# Altium footprint library LegacyRez-Axial Pot.PcbLib: 113 footprints (part 5 of 8)
Each footprint in its own frame and in the unit in brackets; x right, y up, seen from the top. Pads: shape width x height; smd on the part's side, far side on the other; paste and mask are expansions set on the pad; w line width, h text height; cw(c..) or ccw(c..) is an arc to the next point about the centre after c.
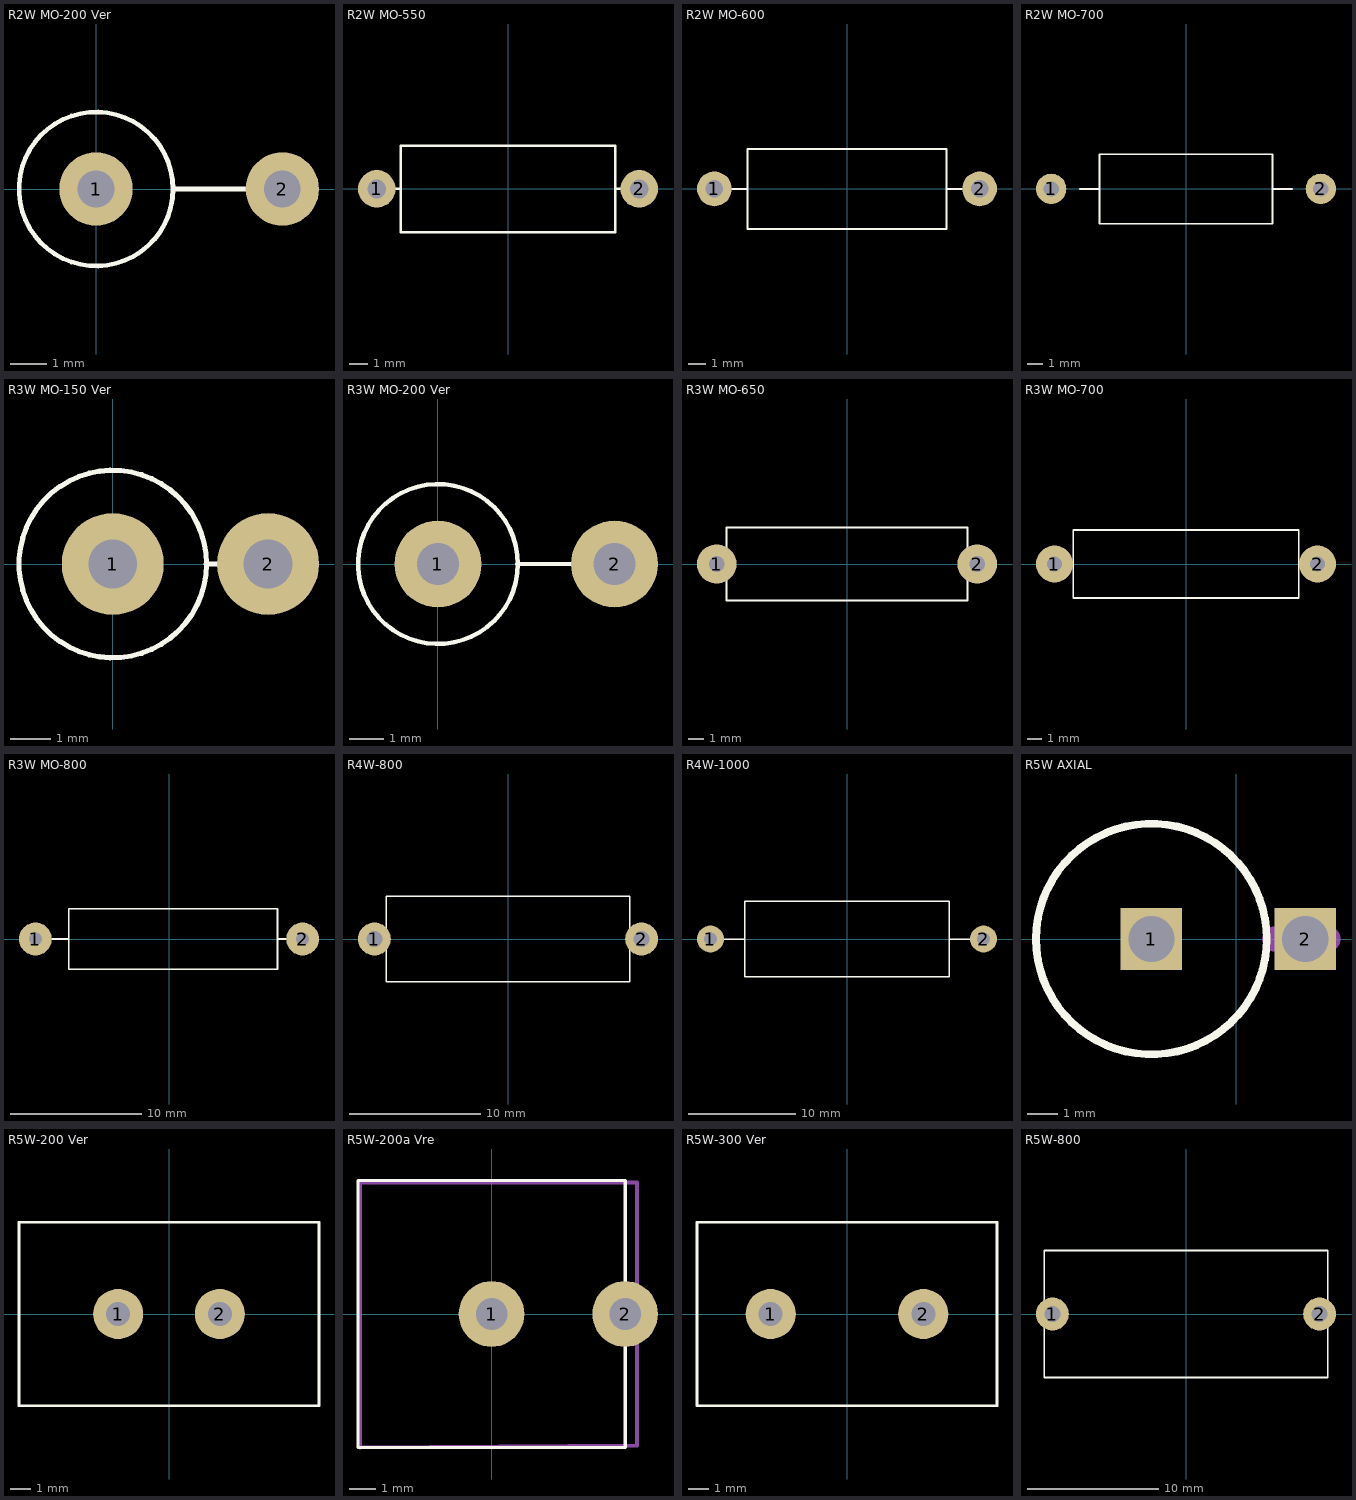
[diagram p4: the footprints below, top view; thin cyan lines are the x and y axes]

## R2W MO-200 Ver [mm]
pads (2):
  round 2 hole 1: 1(0,0) 2(5.08,0)
TopOverlay:
  circle w0.127: c0,0 r2.1
  lines w0.127: 2.1,0 4.572,0
3D body "Res-(2W)MO-200 Ver.STEP": height 15.95, standoff -2.03, extent -2.302,-2.302 5.48,2.302

## R2W MO-550 [mm]
pads (2):
  round 2 hole 1: 1(-6.985,0) 2(6.985,0)
TopOverlay:
  lines w0.127: -6.35,0 -5.715,0 ; 5.715,0 6.35,0 ; -5.715,-2.3 5.715,-2.3 5.715,2.286 -5.715,2.286 -5.715,-2.3
3D body "Res-(2W)MO-550.STEP": height 4.6, standoff -2.54, extent -7.285,-2.3 7.285,2.3

## R2W MO-600 [mm]
pads (2):
  round 2 hole 1: 1(-7.62,0) 2(7.62,0)
TopOverlay:
  lines w0.127: -6.985,0 -5.715,0 ; 5.715,0 6.985,0 ; -5.715,-2.3 5.715,-2.3 5.715,2.286 -5.715,2.286 -5.715,-2.3
3D body "Res-(2W)MO-600.STEP": height 4.6, standoff -2.54, extent -7.92,-2.3 7.92,2.3

## R2W MO-700 [mm]
pads (2):
  round 2 hole 1: 1(-8.89,0) 2(8.89,0)
TopOverlay:
  lines w0.127: -6.985,0 -5.715,0 ; 5.715,0 6.985,0 ; -5.715,-2.3 5.715,-2.3 5.715,2.286 -5.715,2.286 -5.715,-2.3
3D body "Res-(2W)MO-700.STEP": height 4.6, standoff -2.54, extent -9.19,-2.3 9.19,2.3

## R3W MO-150 Ver [mm]
pads (2):
  round 2.5 hole 1.2: 1(0,0) 2(3.81,0)
TopOverlay:
  circle w0.127: c0,0 r2.3
  lines w0.127: 2.286,0 3.175,0
3D body "Res-(3W)MO-150 Ver.STEP": height 18.31, standoff -2.03, extent -2.302,-2.302 4.21,2.302

## R3W MO-200 Ver [mm]
pads (2):
  round 2.5 hole 1.2: 1(0,0) 2(5.08,0)
TopOverlay:
  circle w0.127: c0,0 r2.3
  lines w0.127: 2.286,0 4.445,0
3D body "Res-(3W)MO-200 Ver.STEP": height 18.95, standoff -2.03, extent -2.302,-2.302 5.48,2.302

## R3W MO-650 [mm]
pads (2):
  round 2.5 hole 1: 1(-8.255,0) 2(8.255,0)
TopOverlay:
  lines w0.127: -8.255,0 -7.62,0 ; 7.62,0 8.255,0 ; -7.62,-2.302 -7.62,2.302 7.62,2.302 7.62,-2.302 -7.62,-2.302
3D body "Res-(3W)MO-650.STEP": height 4.6, standoff -2.54, extent -8.605,-2.302 8.605,2.302

## R3W MO-700 [mm]
pads (2):
  round 2.5 hole 1: 1(-8.89,0) 2(8.89,0)
TopOverlay:
  lines w0.127: -8.89,0 -7.62,0 ; 7.62,0 8.89,0 ; -7.62,-2.302 7.62,-2.302 7.62,2.302 -7.62,2.302 -7.62,-2.302
3D body "Res-(3W)MO-700.STEP": height 4.6, standoff -2.54, extent -9.24,-2.302 9.24,2.302

## R3W MO-800 [mm]
pads (2):
  round 2.5 hole 1: 1(-10.16,0) 2(10.16,0)
TopOverlay:
  lines w0.127: -10.16,0 -7.62,0 ; 8.255,0 10.16,0 ; -7.62,-2.302 8.255,-2.302 8.255,2.302 -7.62,2.302 -7.62,-2.302
3D body "Res-(3W)MO-800.STEP": height 4.6, standoff -2.54, extent -10.51,-2.302 10.51,2.302

## R4W-800 [mm]
pads (2):
  round 2.5 hole 1.2: 1(-10.16,0) 2(10.16,0)
TopOverlay:
  lines w0.127: -9.5,0 -9.25,0 ; 9.25,0 9.5,0 ; -9.25,-3.25 -9.25,3.25 9.25,3.25 9.25,-3.25 -9.25,-3.25
3D body "Res 350-8 0.01om.STEP": height 6.5, standoff -2.5, extent -10.56,-3.25 10.56,3.25

## R4W-1000 [mm]
pads (2):
  round 2.5 hole 1.2: 1(-12.7,0) 2(12.7,0)
TopOverlay:
  lines w0.127: -12.7,0 -9.525,0 ; 9.525,0 12.7,0 ; -9.525,-3.5 9.525,-3.5 9.525,3.5 -9.525,3.5 -9.525,-3.5
3D body "Res-(4W)-1000.STEP": height 7.51, standoff -2.94, extent -12.7,-3.5 13.58,3.5

## R5W AXIAL [mm]
pads (2):
  rect 2x2 hole 1.5: 1(-2.75,0) 2(2.25,0)
TopOverlay:
  circle w0.254: c-2.75,0 r3.75
Mechanical3:
  text ".Designator / .Comment" at -4.909,1.238 h1.02
Mechanical13:
  circle w0.1: c-2.75,0 r3.75
  lines w0.8: 1.25,0 3,0
3D body "User Library-Resistor_PTH_AC05_Vishay_5W_Vertical.step": height 21.4, standoff -4.6, extent -6.5,-3.75 4.15,3.75

## R5W-200 Ver [mm]
pads (2):
  round 2.5 hole 1.2: 1(-2.54,0) 2(2.54,0)
TopOverlay:
  lines w0.127: -7.493,-4.572 -7.493,4.572 7.493,4.572 7.493,-4.572 -7.493,-4.572

## R5W-200a Vre [mm]
pads (2):
  round 2.5 hole 1.2: 1(0,0) 2(5.08,0)
TopOverlay:
  lines w0.127: -5.08,-5.08 5.08,-5.08 5.08,5.08 -5.08,5.08 -5.08,-5.08
Mechanical13:
  circle w0.15: c5,0 r0.15
  circle w0.15: c0,0 r0.15
  lines w0.15: 5,0 5.53,0 ; -5.01,5 5.53,5 5.53,-5 -5,-5.08 -5.01,5
3D body "Res-(5W) 200Ver.STEP": height 1.4, standoff -24.05, extent -5.01,-5 5.53,5

## R5W-300 Ver [mm]
pads (2):
  round 2.5 hole 1.2: 1(-3.81,0) 2(3.81,0)
TopOverlay:
  lines w0.127: -7.493,-4.572 -7.493,4.572 7.493,4.572 7.493,-4.572 -7.493,-4.572

## R5W-800 [mm]
pads (2):
  round 2.5 hole 1.2: 1(-10.16,0) 2(10.16,0)
TopOverlay:
  lines w0.127: -10.795,-4.826 -10.795,4.826 10.795,4.826 10.795,-4.826 -10.795,-4.826
3D body "Res-(5W)-800.STEP": height 7.1, standoff -2.4, extent -10.76,-4.8 10.76,4.8